# Altium footprint library Connectors THD.PcbLib: 631 footprints (part 41 of 46) (continued)
## TYCO_3-1734285-3 [mm] "AMPLIMITE HD-20 - Dual Stacked 37 Pins Right Angled D Subminiature Female Connector" (continued)
  text "1" at -26.7,-5.345 h1
  text "20" at -26.875,-2.545 h1
  text "37" at 25.3,-2.57 h1
  text "19" at 26,-5.47 h1
  text "UPPER" at -2.275,-1.03 h1
  text "19" at 26,1.44 h1
  text "37" at 25.3,4.34 h1
  text "20" at -26.875,4.365 h1
  text "1" at -26.7,1.565 h1
  text "LOWER" at -2.275,6.03 h1
3D body: height 31.6, standoff -3.55, extent -34.67,-6.695 34.67,18.755

## TYCO_5-104362-4 [mm] "5 Circuits, Single-Row 2.54mm Centerline, Shrouded Polarized/Latching MTE Header With Swage"
height 13.79
pads (5):
  round 1.8 hole 1.1: 1(-5.08,0) 2(-2.54,0) 3(0,0) 4(2.54,0) 5(5.08,0)
Top Overlay:
  circle w0.3: c-5.177,-3.347 r0.15
  lines w0.2: -7.62,-0.127 -6.604,-0.127 ; -7.62,1.397 -6.604,1.397 ; -7.112,-0.127 -7.112,-2.032 ; -7.112,1.397 -7.112,2.032 ; -5.715,-2.54 -5.715,-2.286 -4.445,-2.286 -4.445,-2.54 ; -5.446,-2.54 -5.446,-2.286 ; -4.714,-2.54 -4.714,-2.286 ; -2.794,-2.54 -1.524,-2.54 ; -2.794,-2.032 -1.524,-2.032 ; 1.524,-2.032 2.794,-2.032 ; 2.794,-2.54 1.524,-2.54 ; 6.604,-0.127 7.62,-0.127 ; 6.604,1.397 7.62,1.397 ; 7.112,-0.127 7.112,-2.032 ; 7.112,1.397 7.112,2.032 ; -7.112,-2.032 -6.604,-1.524 ; -7.112,-2.032 -3.302,-2.032 ; -7.112,2.032 -6.604,1.524 ; -7.112,2.032 7.112,2.032 ; -6.604,-1.524 -1.524,-1.524 -1.524,-2.54 ; -6.604,-1.524 -6.604,1.524 ; -6.604,1.524 -4.445,1.524 -4.445,2.54 -7.62,2.54 -7.62,-2.54 -3.81,-2.54 -3.81,-4.064 3.81,-4.064 3.81,-2.54 7.62,-2.54 7.62,2.54 4.445,2.54 4.445,1.524 6.604,1.524 ; -3.302,-3.556 -2.794,-3.048 ; -3.302,-3.556 -3.302,-2.032 ; -3.302,-3.556 3.302,-3.556 ; -3.302,-2.032 -2.794,-1.524 -2.794,-3.048 ; -2.794,-3.048 2.794,-3.048 ; -1.524,-2.54 1.524,-2.54 ; 1.524,-2.54 1.524,-1.524 6.604,-1.524 ; 2.794,-3.048 3.302,-3.556 ; 2.794,-3.048 2.794,-1.524 3.302,-2.032 ; 3.302,-3.556 3.302,-2.032 ; 3.302,-2.032 7.112,-2.032 ; 6.604,-1.524 7.112,-2.032 ; 6.604,-1.524 6.604,1.524 ; 6.604,1.524 7.112,2.032 ; -3.175,1.524 3.175,1.524 3.175,2.54 -3.175,2.54 -3.175,1.524
Mechanical 8:
  lines w0.1: -5.58,0 -5.08,0 ; -5.08,-0.5 -5.08,0 ; -5.08,0.5 -5.08,0 ; -4.58,0 -5.08,0 ; -3.04,0 -2.54,0 ; -2.54,-0.5 -2.54,0 ; -2.54,0.5 -2.54,0 ; -2.04,0 -2.54,0 ; -0.5,0 0,0 ; 0,-0.5 0,0 ; 0,0.5 0,0 ; 0.5,0 0,0 ; 2.04,0 2.54,0 ; 2.54,-0.5 2.54,0 ; 2.54,0.5 2.54,0 ; 3.04,0 2.54,0 ; 4.58,0 5.08,0 ; 5.08,-0.5 5.08,0 ; 5.08,0.5 5.08,0 ; 5.58,0 5.08,0
Mechanical 14:
  lines w0.1: -7.62,-0.127 -6.604,-0.127 ; -7.62,1.397 -6.604,1.397 ; -7.112,-0.127 -7.112,-2.032 ; -7.112,1.397 -7.112,2.032 ; -5.715,-2.54 -5.715,-2.286 -4.445,-2.286 -4.445,-2.54 ; -5.446,-2.54 -5.446,-2.286 ; -4.714,-2.54 -4.714,-2.286 ; -2.794,-2.54 -1.524,-2.54 ; -2.794,-2.032 -1.524,-2.032 ; 1.524,-2.032 2.794,-2.032 ; 2.794,-2.54 1.524,-2.54 ; 6.604,-0.127 7.62,-0.127 ; 6.604,1.397 7.62,1.397 ; 7.112,-0.127 7.112,-2.032 ; 7.112,1.397 7.112,2.032 ; -7.112,-2.032 -6.604,-1.524 ; -7.112,-2.032 -3.302,-2.032 ; -7.112,2.032 -6.604,1.524 ; -7.112,2.032 7.112,2.032 ; -6.604,-1.524 -1.524,-1.524 -1.524,-2.54 ; -6.604,-1.524 -6.604,1.524 ; -6.604,1.524 -4.445,1.524 -4.445,2.54 -7.62,2.54 -7.62,-2.54 -3.81,-2.54 -3.81,-4.064 3.81,-4.064 3.81,-2.54 7.62,-2.54 7.62,2.54 4.445,2.54 4.445,1.524 6.604,1.524 ; -3.302,-3.556 -2.794,-3.048 ; -3.302,-3.556 -3.302,-2.032 ; -3.302,-3.556 3.302,-3.556 ; -3.302,-2.032 -2.794,-1.524 -2.794,-3.048 ; -2.794,-3.048 2.794,-3.048 ; -1.524,-2.54 1.524,-2.54 ; 1.524,-2.54 1.524,-1.524 6.604,-1.524 ; 2.794,-3.048 3.302,-3.556 ; 2.794,-3.048 2.794,-1.524 3.302,-2.032 ; 3.302,-3.556 3.302,-2.032 ; 3.302,-2.032 7.112,-2.032 ; 6.604,-1.524 7.112,-2.032 ; 6.604,-1.524 6.604,1.524 ; 6.604,1.524 7.112,2.032 ; -3.175,1.524 3.175,1.524 3.175,2.54 -3.175,2.54 -3.175,1.524
3D body: height 13.59, standoff -3.3, extent -7.62,-4.064 7.62,2.54

## TYCO_5-1634506-1 [mm] "50 Ohm BNC PCB Receptacle (Jack), Post Terminal, 4 Legs"
height 16.7
pads (5):
  round 2 hole 1.3: 1(0,0)
  round 3.1 hole 2.4: 2(-3.43,-3.43) 2(-3.43,3.43) 2(3.43,-3.43) 2(3.43,3.43)
Top Overlay:
  circle w0.2: c0,0 r2.5
  lines w0.2: -5.027,-2.311 cw(c0,0) -5.027,2.311 ; -4.695,-1 -5.5,-1 -5.5,1 -4.695,1 ; -4.46,-1.774 cw(c0,0) -4.46,1.774 ; -4.099,-1.598 cw(c0,0) -4.099,1.598 ; -2.311,-5.027 ccw(c0,0) 2.311,-5.027 ; -2.311,5.027 cw(c0,0) 2.311,5.027 ; -1.774,-4.46 ccw(c0,0) 1.774,-4.46 ; -1.774,4.46 cw(c0,0) 1.774,4.46 ; -1.598,-4.099 ccw(c0,0) 1.598,-4.099 ; -1.598,4.099 cw(c0,0) 1.598,4.099 ; 4.099,-1.598 ccw(c0,0) 4.099,1.598 ; 4.46,-1.774 ccw(c0,0) 4.46,1.774 ; 4.695,-1 5.5,-1 5.5,1 4.695,1 ; 5.027,-2.311 ccw(c0,0) 5.027,2.311
Mechanical 8:
  lines w0.1: -4.43,-3.43 -3.43,-3.43 ; -4.43,3.43 -3.43,3.43 ; -3.43,-4.43 -3.43,-3.43 ; -3.43,-2.43 -3.43,-3.43 ; -3.43,2.43 -3.43,3.43 ; -3.43,4.43 -3.43,3.43 ; -2.43,-3.43 -3.43,-3.43 ; -2.43,3.43 -3.43,3.43 ; -1,0 0,0 ; 0,-1 0,0 ; 0,1 0,0 ; 0,4.3 0,5.3 ; 1,0 0,0 ; 2.43,-3.43 3.43,-3.43 ; 2.43,3.43 3.43,3.43 ; 3.43,-4.43 3.43,-3.43 ; 3.43,-2.43 3.43,-3.43 ; 3.43,2.43 3.43,3.43 ; 3.43,4.43 3.43,3.43 ; 4.43,-3.43 3.43,-3.43 ; 4.43,3.43 3.43,3.43
Mechanical 14:
  circle w0.1: c0,0 r0.4
  circle w0.1: c0,0 r1
  circle w0.1: c0,0 r2.5
  circle w0.1: c0,0 r4.8
  circle w0.1: c0,0 r4.4
  circle w0.1: c0,0 r5.533
  lines w0.1: -4.695,-1 -5.5,-1 -5.5,1 -4.695,1 ; 4.695,-1 5.5,-1 5.5,1 4.695,1
3D body: height 16.7, standoff -3.18, extent -5.5,-5.5 5.5,5.5

## TYCO_5-1634556-0 [mm] "Right Angle Bulkhead 75 Ohms BNC"
height 10.94
pads (5):
  round 1.9 hole 1.2: 1(0,0)
  round 2.8 hole 2.1: 2(-3.3,-3.3) 2(-3.3,3.3) 2(3.3,-3.3) 2(3.3,3.3)
Top Overlay:
  circle w0.2: c18.33,0 r1
  lines w0.2: -4.646,-2.262 cw(c0,-0.001) -4.646,2.261 ; -4.364,-1.974 cw(c0,0) -4.364,1.974 ; -2.262,-4.646 ccw(c0,-0.001) 1.939,-4.79 ; -2.261,4.645 cw(c0,-0.001) 1.935,4.79 ; -1.974,-4.364 ccw(c0,0) 0,-4.79 2.482,-4.79 ; -1.974,4.364 cw(c0,0) 0,4.79 2.482,4.79 ; 4.118,-4.79 6.42,-4.79 ; 4.118,4.79 6.42,4.79 ; 6.42,-7.35 7.31,-7.35 7.31,7.331 6.42,7.331 6.42,-7.331 ; 7.31,-1.965 7.77,-2.732 8.23,-1.965 8.69,-2.732 9.15,-1.965 9.61,-2.732 10.07,-1.965 10.53,-2.732 10.99,-1.965 11.45,-2.732 11.91,-1.965 11.96,-1.965 ; 7.31,1.965 7.77,2.732 8.23,1.965 8.69,2.732 9.15,1.965 9.61,2.732 10.07,1.965 10.53,2.732 10.99,1.965 11.45,2.732 11.91,1.965 11.96,1.965 ; 7.31,5.85 7.77,6.15 ; 7.45,-2.199 7.31,-5.85 7.77,-6.15 ; 7.63,2.499 7.77,6.15 ; 7.91,-2.499 7.77,-6.15 ; 8.09,2.199 8.23,5.85 ; 8.37,-2.199 8.23,-5.85 ; 8.55,2.499 8.69,6.15 ; 8.83,-2.499 8.69,-6.15 ; 9.01,2.199 9.15,5.85 ; 9.29,-2.199 9.15,-5.85 ; 9.47,2.499 9.61,6.15 ; 9.75,-2.499 9.61,-6.15 ; 9.93,2.199 10.07,5.85 ; 10.21,-2.199 10.07,-5.85 ; 10.39,2.499 10.53,6.15 ; 10.67,-2.499 10.53,-6.15 ; 10.85,2.199 10.99,5.85 ; 11.13,-2.199 10.99,-5.85 ; 11.31,2.499 11.45,6.15 ; 11.606,-2.471 11.45,-6.15 ; 11.803,2.144 11.96,5.85 ; 11.96,-4.79 22.63,-4.79 22.63,4.79 11.96,4.79 ; 7.77,-6.15 8.23,-5.85 ; 7.77,6.15 8.23,5.85 ; 8.23,-5.85 8.69,-6.15 ; 8.23,5.85 8.69,6.15 ; 8.69,-6.15 9.15,-5.85 ; 8.69,6.15 9.15,5.85 ; 9.15,-5.85 9.61,-6.15 ; 9.15,5.85 9.61,6.15 ; 9.61,-6.15 10.07,-5.85 ; 9.61,6.15 10.07,5.85 ; 10.07,-5.85 10.53,-6.15 ; 10.07,5.85 10.53,6.15 ; 10.53,-6.15 10.99,-5.85 ; 10.53,6.15 10.99,5.85 ; 10.99,-5.85 11.45,-6.15 ; 10.99,5.85 11.45,6.15 ; 11.45,-6.15 11.96,-5.85 11.96,5.85 ; 11.45,6.15 11.96,5.85
Mechanical 8:
  lines w0.1: -3.8,-3.3 -3.3,-3.3 ; -3.8,3.3 -3.3,3.3 ; -3.3,-3.8 -3.3,-3.3 ; -3.3,-2.8 -3.3,-3.3 ; -3.3,2.8 -3.3,3.3 ; -3.3,3.8 -3.3,3.3 ; -2.8,-3.3 -3.3,-3.3 ; -2.8,3.3 -3.3,3.3 ; -0.5,0 0,0 ; 0,-0.5 0,0 ; 0,0.5 0,0 ; 0.5,0 0,0 ; 2.8,-3.3 3.3,-3.3 ; 2.8,3.3 3.3,3.3 ; 3.3,-3.8 3.3,-3.3 ; 3.3,-2.8 3.3,-3.3 ; 3.3,2.8 3.3,3.3 ; 3.3,3.8 3.3,3.3 ; 3.8,-3.3 3.3,-3.3 ; 3.8,3.3 3.3,3.3
Mechanical 14:
  circle w0.1: c18.33,0 r1
  lines w0.1: 1.935,4.79 ccw(c0,-0.001) 1.939,-4.79 ; 6.42,-7.35 7.31,-7.35 7.31,7.331 6.42,7.331 6.42,-7.331 ; 6.42,-4.79 0,-4.79 cw(c0,0) 0,4.79 6.42,4.79 ; 7.31,-1.965 7.77,-2.732 8.23,-1.965 8.69,-2.732 9.15,-1.965 9.61,-2.732 10.07,-1.965 10.53,-2.732 10.99,-1.965 11.45,-2.732 11.91,-1.965 11.96,-1.965 ; 7.31,1.965 7.77,2.732 8.23,1.965 8.69,2.732 9.15,1.965 9.61,2.732 10.07,1.965 10.53,2.732 10.99,1.965 11.45,2.732 11.91,1.965 11.96,1.965 ; 7.31,5.85 7.77,6.15 ; 7.45,-2.199 7.31,-5.85 7.77,-6.15 ; 7.63,2.499 7.77,6.15 ; 7.91,-2.499 7.77,-6.15 ; 8.09,2.199 8.23,5.85 ; 8.37,-2.199 8.23,-5.85 ; 8.55,2.499 8.69,6.15 ; 8.83,-2.499 8.69,-6.15 ; 9.01,2.199 9.15,5.85 ; 9.29,-2.199 9.15,-5.85 ; 9.47,2.499 9.61,6.15 ; 9.75,-2.499 9.61,-6.15 ; 9.93,2.199 10.07,5.85 ; 10.21,-2.199 10.07,-5.85 ; 10.39,2.499 10.53,6.15 ; 10.67,-2.499 10.53,-6.15 ; 10.85,2.199 10.99,5.85 ; 11.13,-2.199 10.99,-5.85 ; 11.31,2.499 11.45,6.15 ; 11.606,-2.471 11.45,-6.15 ; 11.803,2.144 11.96,5.85 ; 11.96,-4.79 22.63,-4.79 22.63,4.79 11.96,4.79 ; 7.77,-6.15 8.23,-5.85 ; 7.77,6.15 8.23,5.85 ; 8.23,-5.85 8.69,-6.15 ; 8.23,5.85 8.69,6.15 ; 8.69,-6.15 9.15,-5.85 ; 8.69,6.15 9.15,5.85 ; 9.15,-5.85 9.61,-6.15 ; 9.15,5.85 9.61,6.15 ; 9.61,-6.15 10.07,-5.85 ; 9.61,6.15 10.07,5.85 ; 10.07,-5.85 10.53,-6.15 ; 10.07,5.85 10.53,6.15 ; 10.53,-6.15 10.99,-5.85 ; 10.53,6.15 10.99,5.85 ; 10.99,-5.85 11.45,-6.15 ; 10.99,5.85 11.45,6.15 ; 11.45,-6.15 11.96,-5.85 11.96,5.85 ; 11.45,6.15 11.96,5.85
3D body: height 11.66, standoff -3.58, extent -5.167,-7.331 22.63,7.432

## TYCO_5-1814832-1 [mm] "50 Ohm SMA Straight PCB Die Socket"
height 13.5
pads (5):
  round 2.2 hole 1.5: 1(0,0)
  round 2.3 hole 1.6: 2(-2.54,-2.54) 2(-2.54,2.54) 2(2.54,-2.54) 2(2.54,2.54)
Top Overlay:
  lines w0.2: -3.2,-1.138 -3.2,1.138 ; -2.921,-1.038 cw(c0,0) -2.921,1.038 ; -2.457,-0.992 cw(c0,0) -2.457,0.992 ; -1.138,-3.2 1.138,-3.2 ; -1.138,3.2 1.138,3.2 ; -1.038,-2.921 ccw(c0,0) 1.038,-2.921 ; -1.038,2.921 cw(c0,0) 1.038,2.921 ; -0.992,-2.457 ccw(c0,0) 0.992,-2.457 ; -0.992,2.457 cw(c0,0) 0.992,2.457 ; 2.457,-0.992 ccw(c0,0) 2.457,0.992 ; 2.921,-1.038 ccw(c0,0) 2.921,1.038 ; 3.2,-1.138 3.2,1.138
Mechanical 8:
  lines w0.1: -3.54,-2.54 -2.54,-2.54 ; -3.54,2.54 -2.54,2.54 ; -2.54,-3.54 -2.54,-2.54 ; -2.54,-1.54 -2.54,-2.54 ; -2.54,1.54 -2.54,2.54 ; -2.54,3.54 -2.54,2.54 ; -1.54,-2.54 -2.54,-2.54 ; -1.54,2.54 -2.54,2.54 ; -1,0 0,0 ; 0,-1 0,0 ; 0,1 0,0 ; 1,0 0,0 ; 1.54,-2.54 2.54,-2.54 ; 1.54,2.54 2.54,2.54 ; 2.54,-3.54 2.54,-2.54 ; 2.54,-1.54 2.54,-2.54 ; 2.54,1.54 2.54,2.54 ; 2.54,3.54 2.54,2.54 ; 3.54,-2.54 2.54,-2.54 ; 3.54,2.54 2.54,2.54
Mechanical 14:
  circle w0.1: c0,0 r0.5
  circle w0.1: c0,0 r2.65
  circle w0.1: c0,0 r3.1
  lines w0.1: -3.2,-2.797 -2.797,-3.2 2.797,-3.2 3.2,-2.797 3.2,2.797 2.797,3.2 -2.797,3.2 -3.2,2.797 -3.2,-2.797
3D body: height 9.5, standoff -4, extent -3.2,-3.2 3.2,3.2

## TYCO_5-6605308-1 [mm] "1 Port, Yellow/Green LEDs, RJ45 10/100Base-T Ethernet, Mag45 Connector Module With Integrated Magnetics"
height 15.24
pads (16):
  round 1.6 hole 0.9: 1(-4.445,-1.27) 2(-3.175,1.27) 3(-1.905,-1.27) 4(-0.635,1.27) 5(0.635,-1.27) 6(1.905,1.27) 7(3.175,-1.27) 8(4.445,1.27)
  round 2.3 hole 1.6: 9(-7.747,-4.572) 10(7.747,-4.572)
  round 1.7 hole 1: D1(-6.325,-12.522) D2(-3.785,-10.998) D3(6.325,-10.998) D4(3.785,-12.522)
  round 1 hole 3.2 unplated mask+1.1: M1(-5.715,-7.62) M2(5.715,-7.62)
Top Overlay:
  lines w0.2: -8.191,-6.057 -8.191,-12.07 -7.937,-12.07 -7.937,-18.42 7.938,-18.42 7.938,-12.07 8.192,-12.07 8.192,-6.057 ; -7.937,-18.352 cw(c-7.683,-17.912) -8.046,-18.268 cw(c-5.783,-16.047) -7.937,-13.721 ; -7.937,-18.013 cw(c-5.783,-16.047) -7.937,-14.082 ; -7.175,-3.053 -7.175,2.408 ; -7.175,-0.64 -7.429,-0.64 -7.429,2.408 7.43,2.408 7.43,-0.64 7.176,-0.64 ; -6.871,-13.647 -6.871,-18.166 -4.077,-18.166 -4.077,-12.705 -4.458,-12.705 -4.458,-17.607 -6.49,-17.607 -6.49,-13.761 ; -6.49,-13.88 -4.458,-13.88 ; -6.242,-18.43 ccw(c-5.296,-15.855) -4.35,-18.43 ; 4.077,-13.738 4.077,-18.166 6.871,-18.166 6.871,-12.705 6.49,-12.705 6.49,-17.607 4.458,-17.607 4.458,-13.576 ; 4.35,-18.43 ccw(c5.296,-15.855) 6.242,-18.43 ; 4.458,-13.88 6.49,-13.88 ; 7.176,-3.053 7.176,2.408 ; 7.938,-18.352 ccw(c7.684,-17.912) 8.046,-18.268 ccw(c5.783,-16.047) 7.938,-13.721 ; 7.938,-18.013 ccw(c5.783,-16.047) 7.938,-14.082
Mechanical 8:
  circle w0.1: c-0.635,1.27 r0.45
  circle w0.1: c1.905,1.27 r0.45
  circle w0.1: c4.445,1.27 r0.45
  circle w0.1: c3.175,-1.27 r0.45
  circle w0.1: c0.635,-1.27 r0.45
  circle w0.1: c-1.905,-1.27 r0.45
  circle w0.1: c-4.445,-1.27 r0.45
  circle w0.1: c-3.175,1.27 r0.45
  circle w0.1: c6.325,-10.998 r0.5
  circle w0.1: c3.785,-12.522 r0.5
  circle w0.1: c-3.785,-10.998 r0.5
  circle w0.1: c-6.325,-12.522 r0.5
  circle w0.1: c5.715,-7.62 r1.6
  circle w0.1: c-5.715,-7.62 r1.6
  circle w0.1: c7.747,-4.572 r0.8
  circle w0.1: c-7.747,-4.572 r0.8
  lines w0.1: -9.2,-14.529 9.2,-14.529 ; -8.247,-4.572 -7.747,-4.572 ; -7.747,-5.072 -7.747,-4.572 ; -7.747,-4.072 -7.747,-4.572 ; -7.247,-4.572 -7.747,-4.572 ; -6.825,-12.522 -6.325,-12.522 ; -6.325,-13.022 -6.325,-12.522 ; -6.325,-12.022 -6.325,-12.522 ; -6.215,-7.62 -5.715,-7.62 ; -5.825,-12.522 -6.325,-12.522 ; -5.715,-8.12 -5.715,-7.62 ; -5.715,-7.12 -5.715,-7.62 ; -5.215,-7.62 -5.715,-7.62 ; -4.945,-1.27 -4.445,-1.27 ; -4.445,-1.77 -4.445,-1.27 ; -4.445,-0.77 -4.445,-1.27 ; -4.285,-10.998 -3.785,-10.998 ; -3.945,-1.27 -4.445,-1.27 ; -3.785,-11.498 -3.785,-10.998 ; -3.785,-10.498 -3.785,-10.998 ; -3.675,1.27 -3.175,1.27 ; -3.285,-10.998 -3.785,-10.998 ; -3.175,0.77 -3.175,1.27 ; -3.175,1.77 -3.175,1.27 ; -2.675,1.27 -3.175,1.27 ; -2.405,-1.27 -1.905,-1.27 ; -1.905,-1.77 -1.905,-1.27 ; -1.905,-0.77 -1.905,-1.27 ; -1.405,-1.27 -1.905,-1.27 ; -1.135,1.27 -0.635,1.27 ; -0.635,0.77 -0.635,1.27 ; -0.635,1.77 -0.635,1.27 ; -0.5,0 0,0 ; -0.135,1.27 -0.635,1.27 ; 0,-0.5 0,0 ; 0,0.5 0,0 ; 0.135,-1.27 0.635,-1.27 ; 0.5,0 0,0 ; 0.635,-1.77 0.635,-1.27 ; 0.635,-0.77 0.635,-1.27 ; 1.135,-1.27 0.635,-1.27 ; 1.405,1.27 1.905,1.27 ; 1.905,0.77 1.905,1.27 ; 1.905,1.77 1.905,1.27 ; 2.405,1.27 1.905,1.27 ; 2.675,-1.27 3.175,-1.27 ; 3.175,-1.77 3.175,-1.27 ; 3.175,-0.77 3.175,-1.27 ; 3.285,-12.522 3.785,-12.522 ; 3.675,-1.27 3.175,-1.27 ; 3.785,-13.022 3.785,-12.522 ; 3.785,-12.022 3.785,-12.522 ; 3.945,1.27 4.445,1.27 ; 4.285,-12.522 3.785,-12.522 ; 4.445,0.77 4.445,1.27 ; 4.445,1.77 4.445,1.27 ; 4.945,1.27 4.445,1.27 ; 5.215,-7.62 5.715,-7.62 ; 5.715,-8.12 5.715,-7.62 ; 5.715,-7.12 5.715,-7.62 ; 5.825,-10.998 6.325,-10.998 ; 6.215,-7.62 5.715,-7.62 ; 6.325,-11.498 6.325,-10.998 ; 6.325,-10.498 6.325,-10.998 ; 6.825,-10.998 6.325,-10.998 ; 7.247,-4.572 7.747,-4.572 ; 7.747,-5.072 7.747,-4.572 ; 7.747,-4.072 7.747,-4.572 ; 8.247,-4.572 7.747,-4.572
Mechanical 14:
  lines w0.1: -7.937,-18.352 cw(c-7.683,-17.912) -8.046,-18.268 cw(c-5.783,-16.047) -7.937,-13.721 ; -7.937,-18.013 cw(c-5.783,-16.047) -7.937,-14.082 ; -7.175,-0.64 -7.429,-0.64 -7.429,2.408 7.43,2.408 7.43,-0.64 7.176,-0.64 ; -7.175,2.408 -7.175,-3.053 -7.937,-3.053 -7.937,-4.45 -8.191,-4.45 -8.191,-12.07 -7.937,-12.07 -7.937,-18.42 7.938,-18.42 7.938,-12.07 8.192,-12.07 8.192,-4.45 7.938,-4.45 7.938,-3.053 7.176,-3.053 7.176,2.408 ; -6.49,-13.88 -4.458,-13.88 ; -6.242,-18.43 ccw(c-5.296,-15.855) -4.35,-18.43 ; 4.35,-18.43 ccw(c5.296,-15.855) 6.242,-18.43 ; 4.458,-13.88 6.49,-13.88 ; 7.938,-18.352 ccw(c7.684,-17.912) 8.046,-18.268 ccw(c5.783,-16.047) 7.938,-13.721 ; 7.938,-18.013 ccw(c5.783,-16.047) 7.938,-14.082 ; -6.871,-18.166 -6.871,-12.705 -6.49,-12.705 -6.49,-17.607 -4.458,-17.607 -4.458,-12.705 -4.077,-12.705 -4.077,-18.166 -6.871,-18.166 ; 4.077,-18.166 4.077,-12.705 4.458,-12.705 4.458,-17.607 6.49,-17.607 6.49,-12.705 6.871,-12.705 6.871,-18.166 4.077,-18.166
3D body: height 14.97, standoff -3.68, extent -8.952,-18.598 8.953,2.408

## TYCO_6-103634-3 [mm] "14 Circuits, Pitch 2.54mm, Right Angle Single-Row Polarized/Latching AMPMODU MTE Header"
height 7.41
pads (14):
  round 1.6 hole 0.9: 1(-16.51,0) 2(-13.97,0) 3(-11.43,0) 4(-8.89,0) 5(-6.35,0) 6(-3.81,0) 7(-1.27,0) 8(1.27,0) 9(3.81,0) 10(6.35,0) 11(8.89,0) 12(11.43,0) 13(13.97,0) 14(16.51,0)
Top Overlay:
  circle w0.3: c-16.533,-1.778 r0.15
  lines w0.2: -17.306,-0.898 -17.424,-1.016 -18.136,-1.016 -18.72,-0.432 -18.72,0.318 -19.05,0.318 -19.05,12.573 19.05,12.573 19.05,0.318 18.72,0.318 18.72,-0.432 18.136,-1.016 17.424,-1.016 17.306,-0.898 ; -17.085,12.575 -16.501,11.991 -15.917,12.575 ; -15.596,-1.016 -14.884,-1.016 ; -13.056,-1.016 -12.344,-1.016 ; -10.516,-1.016 -9.804,-1.016 ; -7.976,-1.016 -7.264,-1.016 ; -5.436,-1.016 -4.724,-1.016 ; -3.81,11.049 3.81,11.049 ; -3.81,12.573 -3.81,8.763 -1.524,8.763 ; -2.896,-1.016 -2.184,-1.016 ; -2.794,8.763 -2.794,11.049 ; -1.587,8.763 -1.587,9.525 -0.952,9.525 ; -0.356,-1.016 0.356,-1.016 ; 0.953,9.525 1.588,9.525 1.588,8.763 ; 1.524,8.763 3.81,8.763 3.81,12.573 ; 2.184,-1.016 2.896,-1.016 ; 2.794,8.763 2.794,11.049 ; 4.724,-1.016 5.436,-1.016 ; 7.264,-1.016 7.976,-1.016 ; 9.804,-1.016 10.516,-1.016 ; 12.344,-1.016 13.056,-1.016 ; 14.884,-1.016 15.596,-1.016 15.714,-0.898
Mechanical 8:
  lines w0.1: -17.01,0 -16.51,0 ; -16.51,-0.5 -16.51,0 ; -16.51,0.5 -16.51,0 ; -16.01,0 -16.51,0 ; -14.47,0 -13.97,0 ; -13.97,-0.5 -13.97,0 ; -13.97,0.5 -13.97,0 ; -13.47,0 -13.97,0 ; -11.93,0 -11.43,0 ; -11.43,-0.5 -11.43,0 ; -11.43,0.5 -11.43,0 ; -10.93,0 -11.43,0 ; -9.39,0 -8.89,0 ; -8.89,-0.5 -8.89,0 ; -8.89,0.5 -8.89,0 ; -8.39,0 -8.89,0 ; -6.85,0 -6.35,0 ; -6.35,-0.5 -6.35,0 ; -6.35,0.5 -6.35,0 ; -5.85,0 -6.35,0 ; -4.31,0 -3.81,0 ; -3.81,-0.5 -3.81,0 ; -3.81,0.5 -3.81,0 ; -3.31,0 -3.81,0 ; -1.77,0 -1.27,0 ; -1.27,-0.5 -1.27,0 ; -1.27,0.5 -1.27,0 ; -0.77,0 -1.27,0 ; -0.354,-0.354 0,0 ; -0.354,0.354 0,0 ; 0.354,-0.354 0,0 ; 0.354,0.354 0,0 ; 0.77,0 1.27,0 ; 1.27,-0.5 1.27,0 ; 1.27,0.5 1.27,0 ; 1.77,0 1.27,0 ; 3.31,0 3.81,0 ; 3.81,-0.5 3.81,0 ; 3.81,0.5 3.81,0 ; 4.31,0 3.81,0 ; 5.85,0 6.35,0 ; 6.35,-0.5 6.35,0 ; 6.35,0.5 6.35,0 ; 6.85,0 6.35,0 ; 8.39,0 8.89,0 ; 8.89,-0.5 8.89,0 ; 8.89,0.5 8.89,0 ; 9.39,0 8.89,0 ; 10.93,0 11.43,0 ; 11.43,-0.5 11.43,0 ; 11.43,0.5 11.43,0 ; 11.93,0 11.43,0 ; 13.47,0 13.97,0 ; 13.97,-0.5 13.97,0 ; 13.97,0.5 13.97,0 ; 14.47,0 13.97,0 ; 16.01,0 16.51,0 ; 16.51,-0.5 16.51,0 ; 16.51,0.5 16.51,0 ; 17.01,0 16.51,0
Mechanical 14:
  lines w0.1: -17.085,12.575 -16.501,11.991 -15.917,12.575 ; -16.84,-0.318 -16.18,-0.318 ; -14.3,-0.318 -13.64,-0.318 ; -11.76,-0.318 -11.1,-0.318 ; -9.22,-0.318 -8.56,-0.318 ; -6.68,-0.318 -6.02,-0.318 ; -4.14,-0.318 -3.48,-0.318 ; -3.81,11.049 3.81,11.049 ; -3.81,12.573 -3.81,8.763 -1.524,8.763 -1.524,3.683 1.524,3.683 1.524,8.763 3.81,8.763 3.81,12.573 ; -2.794,8.763 -2.794,11.049 ; -1.6,-0.318 -0.94,-0.318 ; -1.587,8.763 -1.587,9.525 -0.952,9.525 -0.952,3.683 ; 0.94,-0.318 1.6,-0.318 ; 0.953,3.683 0.953,9.525 1.588,9.525 1.588,8.763 ; 2.794,8.763 2.794,11.049 ; 3.48,-0.318 4.14,-0.318 ; 6.02,-0.318 6.68,-0.318 ; 8.56,-0.318 9.22,-0.318 ; 11.1,-0.318 11.76,-0.318 ; 13.64,-0.318 14.3,-0.318 ; 16.18,-0.318 16.84,-0.318 ; -19.05,0.318 -18.72,0.318 -18.72,-0.432 -18.136,-1.016 -17.424,-1.016 -16.84,-0.432 -16.84,0.318 -16.18,0.318 -16.18,-0.432 -15.596,-1.016 -14.884,-1.016 -14.3,-0.432 -14.3,0.318 -13.64,0.318 -13.64,-0.432 -13.056,-1.016 -12.344,-1.016 -11.76,-0.432 -11.76,0.318 -11.1,0.318 -11.1,-0.432 -10.516,-1.016 -9.804,-1.016 -9.22,-0.432 -9.22,0.318 -8.56,0.318 -8.56,-0.432 -7.976,-1.016 -7.264,-1.016 -6.68,-0.432 -6.68,0.318 -6.02,0.318 -6.02,-0.432 -5.436,-1.016 -4.724,-1.016 -4.14,-0.432 -4.14,0.318 -3.48,0.318 -3.48,-0.432 -2.896,-1.016 -2.184,-1.016 -1.6,-0.432 -1.6,0.318 -0.94,0.318 -0.94,-0.432 -0.356,-1.016 0.356,-1.016 0.94,-0.432 0.94,0.318 1.6,0.318 1.6,-0.432 2.184,-1.016 2.896,-1.016 3.48,-0.432 3.48,0.318 4.14,0.318 4.14,-0.432 4.724,-1.016 5.436,-1.016 6.02,-0.432 6.02,0.318 6.68,0.318 6.68,-0.432 7.264,-1.016 7.976,-1.016 8.56,-0.432 8.56,0.318 9.22,0.318 9.22,-0.432 9.804,-1.016 10.516,-1.016 11.1,-0.432 11.1,0.318 11.76,0.318 11.76,-0.432 12.344,-1.016 13.056,-1.016 13.64,-0.432 13.64,0.318 14.3,0.318 14.3,-0.432 14.884,-1.016 15.596,-1.016 16.18,-0.432 16.18,0.318 16.84,0.318 16.84,-0.432 17.424,-1.016 18.136,-1.016 18.72,-0.432 18.72,0.318 19.05,0.318 19.05,12.573 -19.05,12.573 -19.05,0.318
3D body: height 6.98, standoff -3.3, extent -19.05,-1.016 19.05,12.573

## TYCO_7-215079-8 [mm] "8 Contacts Micro-MaTch Board-Board & Ribbon-Board Connectors"
height 4.1
pads (8):
  round 1.4 hole 0.8: 1(-4.445,-1.27) 2(-3.175,1.27) 3(-1.905,-1.27) 4(-0.635,1.27) 5(0.635,-1.27) 6(1.905,1.27) 7(3.175,-1.27) 8(4.445,1.27)
Top Overlay:
  circle w0.3: c-4.468,-3.048 r0.15
  lines w0.2: -5.445,-1.25 -6.045,-1.25 -6.045,-2.5 6.045,-2.5 6.045,-1.25 5.315,-1.25 ; -5.315,-1.763 -5.315,-2 -5.128,-2 ; -5.315,-0.777 -5.315,2 -3.858,2 ; -5.315,1.25 -6.045,1.25 -6.045,2.5 6.045,2.5 6.045,1.25 5.445,1.25 ; -3.762,-2 -2.588,-2 ; -2.492,2 -1.318,2 ; -1.222,-2 -0.048,-2 ; 0.048,2 1.222,2 ; 1.318,-2 2.492,-2 ; 2.588,2 3.762,2 ; 3.858,-2 5.315,-2 5.315,0.777 ; 5.128,2 5.315,2 5.315,1.763
  text "1" at -5.969,-1.016 h1
  text "8" at 5.613,-0.075 h1
Mechanical 8:
  lines w0.1: -5.445,-1.27 -4.445,-1.27 ; -4.445,-2.27 -4.445,-1.27 ; -4.445,-0.27 -4.445,-1.27 ; -4.175,1.27 -3.175,1.27 ; -3.445,-1.27 -4.445,-1.27 ; -3.175,0.27 -3.175,1.27 ; -3.175,2.27 -3.175,1.27 ; -2.905,-1.27 -1.905,-1.27 ; -2.175,1.27 -3.175,1.27 ; -1.905,-2.27 -1.905,-1.27 ; -1.905,-0.27 -1.905,-1.27 ; -1.635,1.27 -0.635,1.27 ; -1,0 0,0 ; -0.905,-1.27 -1.905,-1.27 ; -0.635,0.27 -0.635,1.27 ; -0.635,2.27 -0.635,1.27 ; -0.365,-1.27 0.635,-1.27 ; 0,-1 0,0 ; 0,1 0,0 ; 0.365,1.27 -0.635,1.27 ; 0.635,-2.27 0.635,-1.27 ; 0.635,-0.27 0.635,-1.27 ; 0.905,1.27 1.905,1.27 ; 1,0 0,0 ; 1.635,-1.27 0.635,-1.27 ; 1.905,0.27 1.905,1.27 ; 1.905,2.27 1.905,1.27 ; 2.175,-1.27 3.175,-1.27 ; 2.905,1.27 1.905,1.27 ; 3.175,-2.27 3.175,-1.27 ; 3.175,-0.27 3.175,-1.27 ; 3.445,1.27 4.445,1.27 ; 4.175,-1.27 3.175,-1.27 ; 4.445,0.27 4.445,1.27 ; 4.445,2.27 4.445,1.27 ; 5.445,1.27 4.445,1.27
Mechanical 14:
  drawing of 208 lines, arcs and shapes, not listed
  text "1" at -5.969,-1.016 h1
  text "8" at 5.613,-0.075 h1
3D body: height 4, standoff -3, extent -6.045,-2.5 6.045,2.5

## TYCO_62409-1 [mm] "6.3 x 0.8mm FASTON Tab for Printed Circuit Board"
height 12.62
pads (2):
  round 2.2 hole 1.5: 1(-2.54,0) 1(2.54,0)
Top Overlay:
  lines w0.2: -1.27,-0.4 1.27,-0.4 ; -1.27,0.4 1.27,0.4
Mechanical 8:
  lines w0.1: -3.54,0 -2.54,0 -2.54,-1 ; 1.54,0 2.54,0 2.54,-1
Mechanical 14:
  lines w0.1: -3.746,-0.4 -3.746,0.4 3.747,0.4 3.747,-0.4 -3.746,-0.4
3D body: height 12.62, standoff -3.17, extent -3.746,-0.4 3.747,0.4

## TYCO_292304-1 [mm] "Thru Hole, Right Angle, 4 Position, Type B, USB Receptacle"
height 11.5
pads (6):
  round 1.7 hole 1: 1(1.25,1) 2(-1.25,1) 3(-1.25,-1) 4(1.25,-1)
  round 3 hole 2.3: 5(-6.02,-3.71) 5(6.02,-3.71)
Top Overlay:
  circle w0.3: c1.257,2.427 r0.15
  lines w0.2: -6.13,-1.913 -6.13,1.72 -2.147,1.72 ; -6.018,-5.51 -6.018,-13.98 6.018,-13.98 6.018,-5.51 ; -5.6,-1.96 -5.6,1.72 ; -4.544,-2.68 4.544,-2.68 ; -1.25,-13.98 -1.25,-12.832 cw(c-1,-12.83) -0.75,-12.832 -0.75,-13.98 ; -1.25,-13.662 -0.75,-13.662 ; -1.25,-13.568 -0.75,-13.568 ; -0.75,-13.342 0.75,-13.342 ; 0.75,-13.98 0.75,-12.832 cw(c1,-12.83) 1.25,-12.832 1.25,-13.98 ; 0.75,-13.662 1.25,-13.662 ; 0.75,-13.568 1.25,-13.568 ; 2.147,1.72 6.13,1.72 6.13,-1.913 ; 5.6,-1.96 5.6,1.72
Mechanical 8:
  lines w0.1: -7.02,-3.71 -6.02,-3.71 ; -6.02,-4.71 -6.02,-3.71 ; -6.02,-2.71 -6.02,-3.71 ; -5.02,-3.71 -6.02,-3.71 ; -2.25,-1 -1.25,-1 ; -2.25,1 -1.25,1 ; -1.25,-2 -1.25,-1 ; -1.25,2 -1.25,1 ; -1,0 0,0 ; -0.25,-1 -1.25,-1 ; -0.25,1 -1.25,1 ; 0,-1 0,0 ; 0,1 0,0 ; 0.25,-1 1.25,-1 ; 0.25,1 1.25,1 ; 1,0 0,0 ; 1.25,-2 1.25,-1 ; 1.25,2 1.25,1 ; 2.25,-1 1.25,-1 ; 2.25,1 1.25,1 ; 5.02,-3.71 6.02,-3.71 ; -1.25,-1 -1.25,0 -1.25,1 ; 1.25,-1 1.25,0 1.25,1 ; 6.02,-4.71 6.02,-3.71 ; 6.02,-4.71 6.02,-3.71 ; 6.02,-4.71 6.02,-3.71 ; 6.02,-3.71 7.02,-3.71 ; 6.02,-3.71 6.02,-2.71 ; 6.02,-3.71 7.02,-3.71 ; 6.02,-3.71 6.02,-2.71 ; 6.02,-3.71 7.02,-3.71 ; 6.02,-3.71 6.02,-2.71
Mechanical 14:
  lines w0.1: -6.13,-4.608 -6.13,-4.81 -6.018,-5.057 ; -6.018,-4.619 -7.096,-4.511 ; -6.018,-2.781 -7.096,-2.889 ; -5.6,-2.68 -5.6,1.72 ; -5.6,-2.28 -6.13,-2.28 -6.13,1.72 6.13,1.72 6.13,-2.28 5.6,-2.28 ; -1.25,-13.98 -1.25,-12.832 cw(c-1,-12.83) -0.75,-12.832 -0.75,-13.98 ; -1.25,-13.662 -0.75,-13.662 ; -1.25,-13.568 -0.75,-13.568 ; -0.75,-13.342 0.75,-13.342 ; 0.75,-13.98 0.75,-12.832 cw(c1,-12.83) 1.25,-12.832 1.25,-13.98 ; 0.75,-13.662 1.25,-13.662 ; 0.75,-13.568 1.25,-13.568 ; 5.6,-2.68 5.6,1.72 ; 6.018,-5.057 6.13,-4.81 6.13,-4.608 ; 6.018,-4.619 7.096,-4.511 ; 6.018,-2.781 7.096,-2.889 ; -7.096,-4.511 -7.162,-4.5 -7.192,-4.486 -7.195,-4.479 -7.195,-2.921 -7.192,-2.914 -7.162,-2.9 -7.096,-2.889 ; -7.096,-4.511 -7.096,-2.889 ; 7.096,-4.511 7.162,-4.5 7.192,-4.486 7.195,-4.479 7.195,-2.921 7.192,-2.914 7.162,-2.9 7.096,-2.889 ; 7.096,-4.511 7.096,-2.889 ; -6.018,-13.98 6.018,-13.98 6.018,-2.68 -6.018,-2.68 -6.018,-13.98
3D body: height 11.5, standoff -3.93, extent -7.194,-13.98 7.195,1.72